# Altium footprint library E-Stall_lib.PcbLib: 112 footprints (part 6 of 7)
Each footprint in its own frame and in the unit in brackets; x right, y up, seen from the top. Pads: shape width x height; smd on the part's side, far side on the other; paste and mask are expansions set on the pad; w line width, h text height; cw(c..) or ccw(c..) is an arc to the next point about the centre after c.
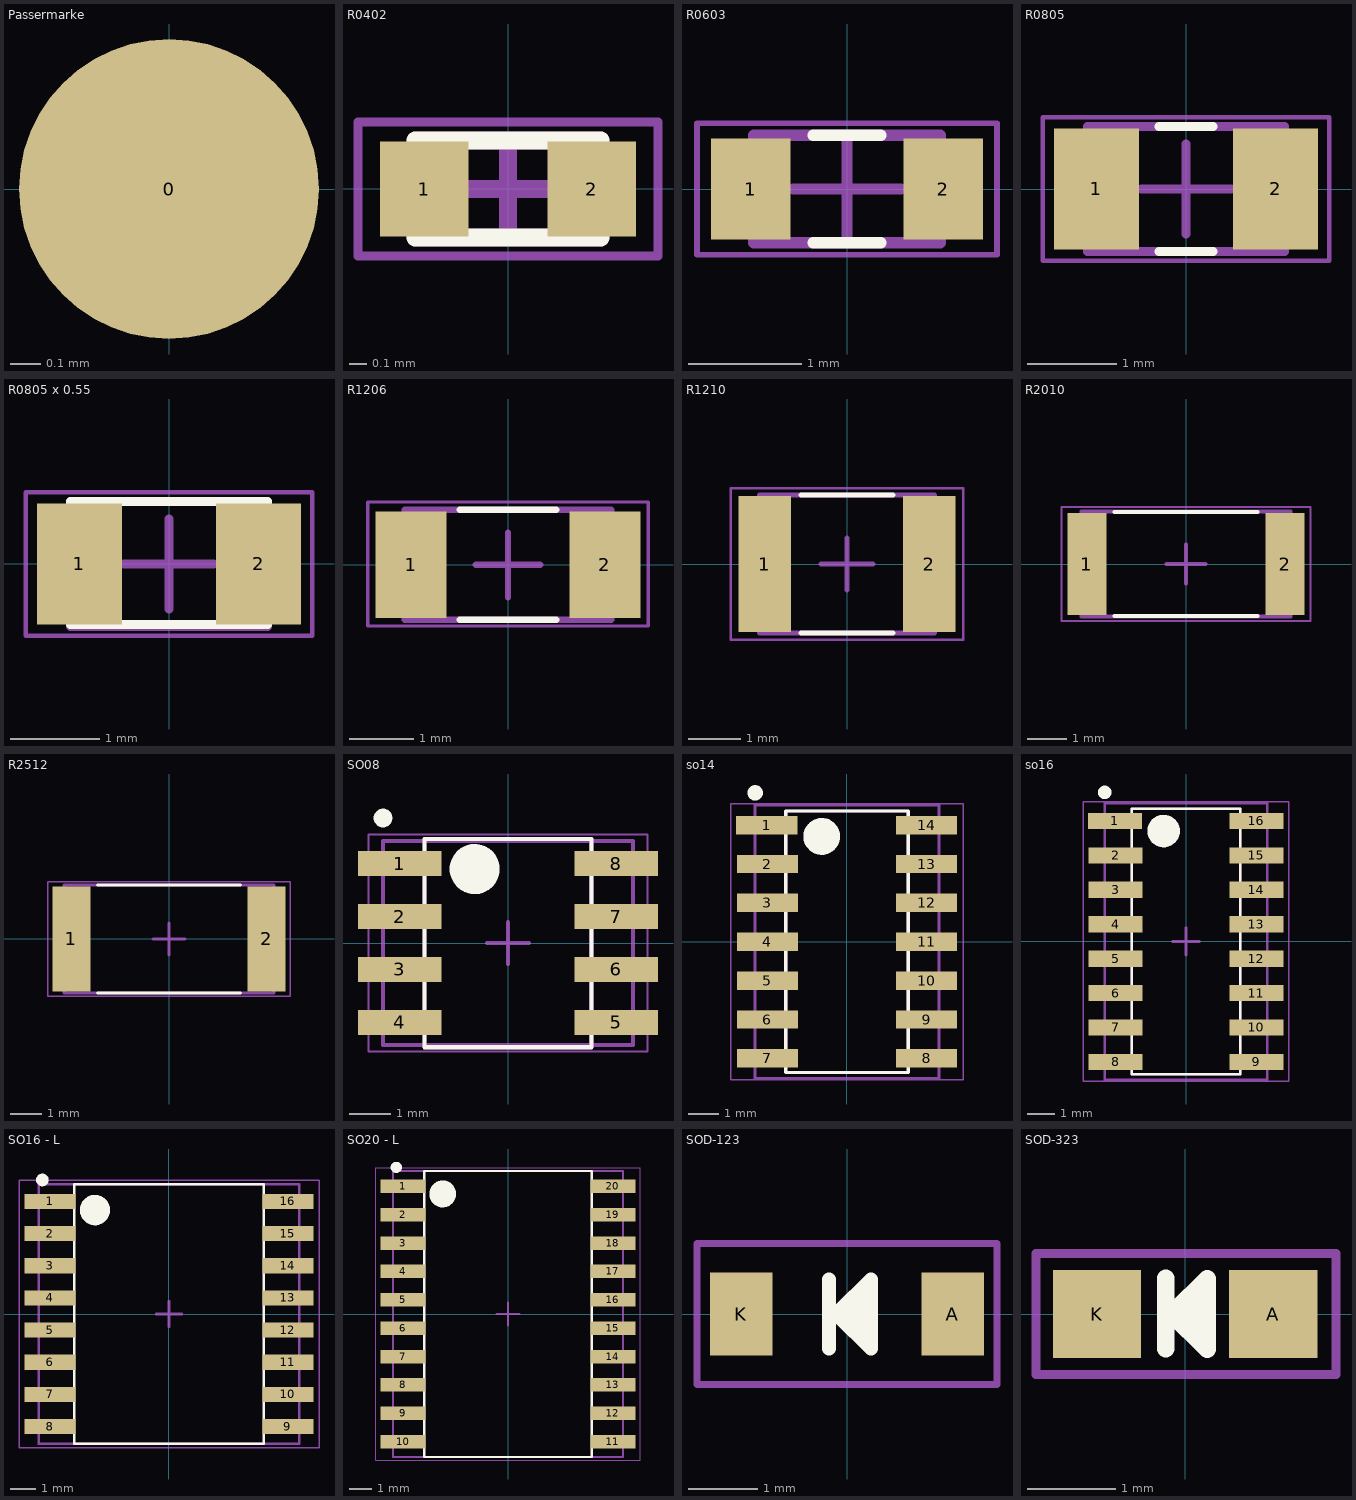
[diagram p5: the footprints below, top view; thin cyan lines are the x and y axes]

## Passermarke [mm]
pads (1):
  round 1 smd paste+0 mask+0.5: 0(0,0)

## R0402 [mm] "Chip Resistor, 2-Leads, Body 1,00x0,50mm, IPC High Density"
height 0.35
pads (2):
  rect 0.5x0.54 smd: 1(-0.475,0) 2(0.475,0)
Top Overlay:
  lines w0.1: -0.525,-0.275 -0.525,0.275 0.525,0.275 0.525,-0.275 -0.525,-0.275
Mechanical 13:
  lines w0.1: -0.525,-0.275 0.525,-0.275 0.525,0.275 -0.525,0.275 -0.525,-0.275
Mechanical 15:
  lines w0.05: -0.85,-0.38 0.85,-0.38 0.85,0.38 -0.85,0.38 -0.85,-0.38
  lines w0.1: -0.275,0 0.275,0 ; 0,-0.275 0,0.275
3D body "RESC1005X04L.step": height 0.4, standoff 0, extent -0.525,-0.275 0.525,0.275

## R0603 [mm] "Chip Resistor, 2-Leads, Body 1,57x0,85mm, IPC High Density"
height 0.5
pads (2):
  rect 0.7x0.89 smd: 1(-0.85,0) 2(0.85,0)
Top Overlay:
  lines w0.1: -0.3,-0.475 0.3,-0.475 ; -0.3,0.475 0.3,0.475
Mechanical 13:
  lines w0.1: -0.825,-0.475 -0.825,0.475 0.825,0.475 0.825,-0.475 -0.825,-0.475
Mechanical 15:
  lines w0.05: -1.325,-0.58 -1.325,0.58 1.325,0.58 1.325,-0.58 -1.325,-0.58
  lines w0.1: -0.475,0 0.475,0 ; 0,-0.475 0,0.475
3D body "RESC1608X05L.step": height 0.5, standoff 0, extent -0.825,-0.475 0.825,0.475

## R0805 [mm] "Chip Resistor, 2-Leads, Body 2,05x1,25mm, IPC High Density"
height 0.5
pads (2):
  rect 0.95x1.35 smd: 1(-1,0) 2(1,0)
Top Overlay:
  lines w0.1: -0.3,-0.7 0.3,-0.7 ; -0.3,0.7 0.3,0.7
Mechanical 13:
  lines w0.1: -1.1,-0.7 1.1,-0.7 1.1,0.7 -1.1,0.7 -1.1,-0.7
Mechanical 15:
  lines w0.05: -1.6,-0.8 1.6,-0.8 1.6,0.8 -1.6,0.8 -1.6,-0.8
  lines w0.1: -0.5,0 0.5,0 ; 0,-0.5 0,0.5
3D body "RESC2112X05L.step": height 0.5, standoff 0, extent -1.1,-0.7 1.1,0.7

## R0805 x 0.55 [mm] "Chip Resistor, 2-Leads, Body 2,05x1,25mm, IPC High Density"
height 0.55
pads (2):
  rect 0.95x1.35 smd: 1(-1,0) 2(1,0)
Top Overlay:
  lines w0.1: -1.1,-0.675 -1.1,0.7 1.1,0.7 1.1,-0.675 -1.1,-0.675
Mechanical 13:
  lines w0.1: -1.1,-0.7 1.1,-0.7 1.1,0.7 -1.1,0.7 -1.1,-0.7
Mechanical 15:
  lines w0.05: -1.6,-0.8 1.6,-0.8 1.6,0.8 -1.6,0.8 -1.6,-0.8
  lines w0.1: -0.5,0 0.5,0 ; 0,-0.5 0,0.5
3D body "RESC2112X05L.step": height 0.5, standoff 0, extent -1.1,-0.7 1.1,0.7

## R1206 [mm] "Chip Resistor, 2-Leads, Body 3,10x1,57mm, IPC High Density"
height 0.65
pads (2):
  rect 1.1x1.65 smd: 1(-1.5,0) 2(1.5,0)
Top Overlay:
  lines w0.1: -0.75,-0.85 0.75,-0.85 ; -0.75,0.85 0.75,0.85
Mechanical 13:
  lines w0.1: -1.6,-0.85 1.6,-0.85 1.6,0.85 -1.6,0.85 -1.6,-0.85
Mechanical 15:
  lines w0.05: -2.175,-0.95 1.9,-0.95 2.175,-0.95 2.175,0.975 1.9,0.975 -2.175,0.975 -2.175,-0.95
  lines w0.1: -0.5,0 0.5,0 ; 0,-0.5 0,0.5
3D body "RESC3116X07L.step": height 0.65, standoff 0, extent -1.6,-0.85 1.6,0.85

## R1210 [mm] "Chip Resistor, 2-Leads, Body 3,20x2,50mm, IPC High Density"
height 0.65
pads (2):
  rect 1x2.6 smd: 1(-1.575,0) 2(1.575,0)
Top Overlay:
  lines w0.1: -0.875,-1.325 0.875,-1.325 ; -0.875,1.325 0.875,1.325
Mechanical 13:
  lines w0.1: -1.675,-1.325 -1.675,1.325 1.675,1.325 1.675,-1.325 -1.675,-1.325
Mechanical 15:
  lines w0.05: -2.225,-1.45 -2.225,1.45 2.225,1.45 2.225,-1.45 -2.225,-1.45
  lines w0.1: -0.5,0 0.5,0 ; 0,-0.5 0,0.5
3D body "RESC3225X07L.step": height 0.65, standoff 0, extent -1.675,-1.325 1.675,1.325

## R2010 [mm] "Chip Resistor, 2-Leads, Body 5,14x2,54mm, IPC High Density"
height 0.76
pads (2):
  rect 1x2.6 smd: 1(-2.525,0) 2(2.525,0)
Top Overlay:
  lines w0.1: -1.825,-1.325 1.825,-1.325 ; -1.825,1.325 1.825,1.325
Mechanical 13:
  lines w0.1: -2.665,-1.335 -2.665,1.335 2.665,1.335 2.665,-1.335 -2.665,-1.335
Mechanical 15:
  lines w0.05: -3.175,-1.45 -3.175,1.45 3.175,1.45 3.175,-1.45 -3.175,-1.45
  lines w0.1: -0.5,0 0.5,0 ; 0,-0.5 0,0.5
3D body "RESC5125X08L.step": height 0.76, standoff 0, extent -2.665,-1.335 2.665,1.335

## R2512 [mm] "Chip Resistor, 2-Leads, Body 6,40x3,20mm, IPC High Density"
height 0.7
pads (2):
  rect 1.2x3.3 smd: 1(-3.075,0) 2(3.075,0)
Top Overlay:
  lines w0.1: -2.25,-1.7 2.25,-1.7 ; -2.25,1.7 2.25,1.7
Mechanical 13:
  lines w0.1: -3.3,-1.7 3.3,-1.7 3.3,1.7 -3.3,1.7 -3.3,-1.7
Mechanical 15:
  lines w0.05: -3.825,-1.8 3.825,-1.8 3.825,1.8 -3.825,1.8 -3.825,-1.8
  lines w0.1: -0.5,0 0.5,0 ; 0,-0.5 0,0.5
3D body "RESC6432X07L.step": height 0.7, standoff 0, extent -3.3,-1.7 3.3,1.7

## SO08 [mm] "SOIC, 8-Leads, Body 4,90x3,90mm, Pitch 1,27mm, IPC High Density"
height 1.75
pads (8):
  rect 2x0.6 smd: 1(-2.6,1.905) 2(-2.6,0.635) 3(-2.6,-0.635) 4(-2.6,-1.905) 5(2.6,-1.905) 6(2.6,-0.635) 7(2.6,0.635) 8(2.6,1.905)
Top Overlay:
  circle w0.25: c-3,3 r0.098
  circle w0.6: c-0.8,1.775 r0.3
  lines w0.1: -2,-2.5 2,-2.5 2,2.5 -2,2.5 -2,-2.5
Mechanical 13:
  circle w0.1: c-0.8,1.775 r0.5
  lines w0.1: -3,-2.45 3,-2.45 3,2.45 -3,2.45 -3,-2.45 ; -2,-2.5 -2,2.5 2,2.5 2,-2.5 -2,-2.5
Mechanical 15:
  lines w0.05: -3.35,-2.6 -3.35,2.6 3.35,2.6 3.35,-2.6 -3.35,-2.6
  lines w0.1: -0.5,0 0.5,0 -0.5,0 ; 0,-0.5 0,0.5 0,-0.5
3D body "SO08.STEP": height 1.7, standoff 0, extent -3,-2.45 3,2.45

## so14 [mm]
pads (14):
  rect 2x0.6 smd: 1(-2.612,3.81) 2(-2.587,2.54) 3(-2.587,1.27) 4(-2.587,0) 5(-2.587,-1.27) 6(-2.587,-2.54) 7(-2.587,-3.81) 8(2.613,-3.81) 9(2.613,-2.54) 10(2.613,-1.27) 11(2.613,0) 12(2.613,1.27) 13(2.613,2.54) 14(2.613,3.81)
Top Overlay:
  circle w0.6: c-0.812,3.44 r0.3
  circle w0.25: c-2.987,4.865 r0.125
  lines w0.1: -1.987,-4.265 2.013,-4.265 2.013,4.265 1.613,4.265 -1.587,4.265 -1.987,4.265 -1.987,-4.265
Mechanical 13:
  circle w0.1: c-0.812,3.465 r0.5
  lines w0.1: -2.987,-4.465 -2.987,4.465 3.013,4.465 3.013,-4.465 -2.972,-4.465 -2.987,-4.45 ; -1.987,-3.91 -1.987,4.265 2.013,4.265 2.013,-3.91
Mechanical 15:
  lines w0.05: -3.787,-4.515 3.813,-4.515 3.813,4.515 -3.787,4.515 -3.787,-4.515

## so16 [mm]
pads (16):
  rect 2x0.6 smd: 1(-2.625,4.445) 2(-2.6,3.175) 3(-2.6,1.905) 4(-2.6,0.635) 5(-2.6,-0.635) 6(-2.6,-1.905) 7(-2.6,-3.175) 8(-2.6,-4.445) 9(2.6,-4.445) 10(2.6,-3.175) 11(2.6,-1.905) 12(2.6,-0.635) 13(2.6,0.635) 14(2.6,1.905) 15(2.6,3.175) 16(2.6,4.445)
Top Overlay:
  circle w0.6: c-0.825,4.075 r0.3
  circle w0.25: c-3,5.5 r0.125
  lines w0.1: -1.6,-4.9 1.6,-4.9 ; 1.6,-4.9 2,-4.9 2,4.9 1.6,4.9 -1.6,4.9 -2,4.9 -2,-4.9 1.6,-4.9
Mechanical 13:
  circle w0.1: c-0.825,4.1 r0.5
  lines w0.1: -3,-5.1 -3,5.1 3,5.1 3,-5.1 -3,-5.1 ; -2,-4.9 2,-4.9 2,4.9 -2,4.9 -2,-4.9
Mechanical 15:
  lines w0.05: -3.8,-5.15 3.8,-5.15 3.8,5.15 -3.8,5.15 -3.8,-5.15
  lines w0.1: -0.5,0 0.5,0 ; 0,-0.5 0,0.5
3D body "so16.STEP": height 1.7, standoff 0, extent -3,-5.1 3,5.1

## SO16 - L [mm] "SOIC, 16-Leads, Body 10,30x7,50mm, Pitch 1,27mm, IPC Medium Density"
height 2.65
pads (16):
  rect 2x0.6 smd: 1(-4.7,4.445) 2(-4.7,3.175) 3(-4.7,1.905) 4(-4.7,0.635) 5(-4.7,-0.635) 6(-4.7,-1.905) 7(-4.7,-3.175) 8(-4.7,-4.445) 9(4.7,-4.445) 10(4.7,-3.175) 11(4.7,-1.905) 12(4.7,-0.635) 13(4.7,0.635) 14(4.7,1.905) 15(4.7,3.175) 16(4.7,4.445)
Top Overlay:
  circle w0.6: c-2.925,4.105 r0.3
  circle w0.25: c-5,5.295 r0.125
  lines w0.1: 3.75,-5.13 -3.75,-5.13 -3.75,5.13 3.75,5.13 3.75,-5.125
Mechanical 13:
  circle w0.1: c-2.9,4.13 r0.5
  lines w0.1: -5.15,-5.13 5.15,-5.13 5.15,5.13 -5.15,5.13 -5.15,-5.13 ; -5.15,-5.13 -5.15,-5.13
Mechanical 15:
  lines w0.05: -5.925,-5.28 5.925,-5.28 5.925,5.28 -5.925,5.28 -5.925,-5.28
  lines w0.1: -0.5,0 0.5,0 ; 0,-0.5 0,0.5
3D body "SO16 - L.STEP": height 2.48, standoff 0, extent -5.155,-5.165 5.155,5.165

## SO20 - L [mm] "SOIC, 20-Leads, Body 12,80x7,50mm, Pitch 1,27mm, IPC Medium Density"
height 2.65
pads (20):
  rect 2x0.6 smd: 1(-4.7,5.715) 2(-4.7,4.445) 3(-4.7,3.175) 4(-4.7,1.905) 5(-4.7,0.635) 6(-4.7,-0.635) 7(-4.7,-1.905) 8(-4.7,-3.175) 9(-4.7,-4.445) 10(-4.7,-5.715) 11(4.7,-5.715) 12(4.7,-4.445) 13(4.7,-3.175) 14(4.7,-1.905) 15(4.7,-0.635) 16(4.7,0.635) 17(4.7,1.905) 18(4.7,3.175) 19(4.7,4.445) 20(4.7,5.715)
Top Overlay:
  circle w0.25: c-5,6.565 r0.125
  circle w0.6: c-2.925,5.375 r0.3
  lines w0.1: -3.75,-6.4 3.75,-6.4 3.75,6.4 -3.75,6.4 -3.75,-6.4
Mechanical 13:
  circle w0.1: c-2.9,5.4 r0.5
  lines w0.1: -5.15,-6.4 5.15,-6.4 5.15,6.4 -5.15,6.4 -5.15,-6.4 ; -5.15,-6.4 -5.15,-6.4
Mechanical 15:
  lines w0.05: -5.925,-6.55 -5.925,6.55 5.925,6.55 5.925,-6.55 -5.925,-6.55
  lines w0.1: -0.5,0 0.5,0 ; 0,-0.5 0,0.5
3D body "SO20 - L.STEP": height 2.7, standoff 0, extent -5.15,-6.4 5.15,6.4

## SOD-123 [mm]
pads (2):
  rect 0.9x1.2 smd: A(1.524,0) K(-1.524,0)
Top Overlay:
  lines w0.1: -0.257,0 0.343,0 ; 0.093,0.25 0.201,0.358 ; 0.201,-0.358 0.343,-0.5
  lines w0.15: 0.201,-0.358 0.201,0.358
  lines w0.2: -0.257,-0.5 -0.257,0.5 ; 0.093,-0.25 0.093,0.25 ; -0.157,0 0.343,-0.5 0.343,0.5 -0.157,0
Mechanical 15:
  lines w0.102: -2.159,-1.016 -2.159,1.016 2.159,1.016 2.159,-1.016 -2.159,-1.016
3D body: height 0.79, standoff 0.74, extent -1.049,-0.75 -0.924,0.75
3D body: height 0.7, standoff 0, extent -1.511,-0.25 -1.386,0.25
3D body: height 0.7, standoff 0.5, extent -1.399,-0.25 -1.299,0.25
3D body: height 0.2, standoff 0, extent -1.699,-0.25 -1.499,0.25
3D body: height 0.76, standoff 0, extent -1.299,-0.875 1.376,0.875
3D body: height 0.2, standoff 0, extent 1.576,-0.225 1.776,0.275
3D body: height 0.7, standoff 0.5, extent 1.376,-0.225 1.476,0.275
3D body: height 0.7, standoff 0, extent 1.463,-0.225 1.588,0.275

## SOD-323 [mm]
pads (2):
  rect 1x1 smd: A(1,0) K(-1,0)
Top Overlay:
  lines w0.1: 0.049,-0.2 0.049,0.2 0.049,-0.2
  lines w0.18: -0.219,0.006 0.243,0.006 ; 0.049,-0.2 0.249,0
  lines w0.2: -0.219,-0.394 -0.219,0.406 ; 0.049,0.2 0.243,0.006 ; -0.151,0 0.249,0.4 0.249,-0.4 -0.151,0
Mechanical 15:
  lines w0.102: -1.692,-0.686 1.711,-0.686 1.711,0.686 -1.692,0.686 -1.692,-0.686
3D body: height 0.74, standoff 0.71, extent -0.9,-0.475 -0.725,0.5
3D body: height 0.69, standoff 0, extent -1.025,-0.65 1,0.65
3D body: height 0.25, standoff 0, extent -1.225,-0.175 -0.875,0.175
3D body: height 0.25, standoff 0, extent 0.825,-0.2 1.175,0.15